# Altium footprint library Connectors.PCBLIB: 109 footprints (part 1 of 7)
Each footprint in its own frame and in the unit in brackets; x right, y up, seen from the top. Pads: shape width x height; smd on the part's side, far side on the other; paste and mask are expansions set on the pad; w line width, h text height; cw(c..) or ccw(c..) is an arc to the next point about the centre after c.
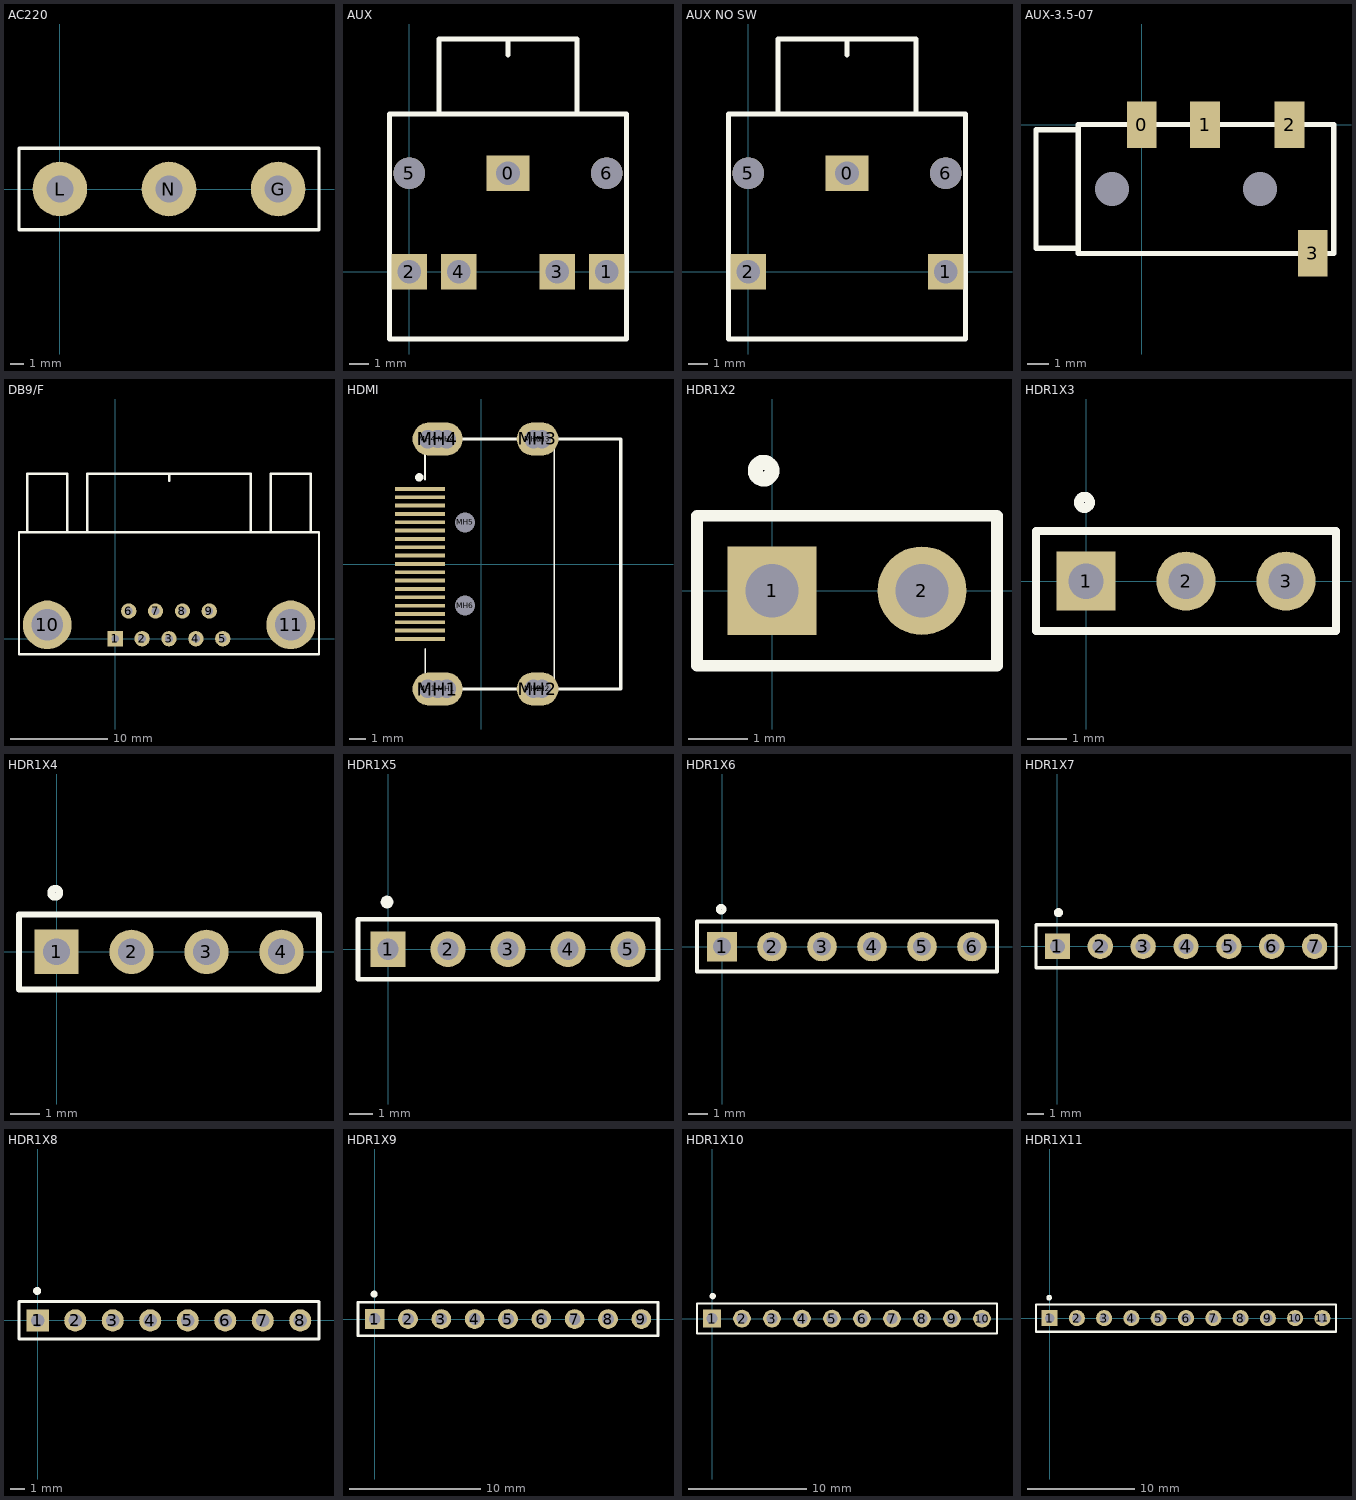
[diagram p0: the footprints below, top view; thin cyan lines are the x and y axes]

## AC220 [mm]
pads (3):
  round 4 hole 2: G(16,0) L(0,0) N(8,0)
Top Overlay:
  lines w0.254: -3,-3 -3,3 19,3 19,-3 -3,-3

## AUX [mm]
pads (7):
  rect 2.2x1.8 hole 1.2: 0(5,5)
  rect 1.8x1.8 hole 1.2: 1(10,0) 2(0,0) 3(7.5,0) 4(2.5,0)
  round 1.6 hole 1.6 unplated: 5(0,5) 6(10,5)
Top Overlay:
  lines w0.254: 1.5,8 1.5,11.8 8.4,11.8 ; 5,11 5,11.8 ; 8.5,8 8.5,11.8 ; -1,-3.4 11,-3.4 11,8 -1,8 -1,-3.4
3D body "耳": height 3.2, standoff -10.8, extent -1.041,-3.689 11.059,11.411

## AUX NO SW [mm]
pads (5):
  rect 2.2x1.8 hole 1.2: 0(5,5)
  rect 1.8x1.8 hole 1.2: 1(10,0) 2(0,0)
  round 1.6 hole 1.6 unplated: 5(0,5) 6(10,5)
Top Overlay:
  lines w0.254: 1.5,8 1.5,11.8 8.4,11.8 ; 5,11 5,11.8 ; 8.5,8 8.5,11.8 ; -1,-3.4 -1,8 11,8 11,-3.4 -1,-3.4
3D body "耳": height 3.2, standoff -10.8, extent -1.041,-3.689 11.059,11.411

## AUX-3.5-07 [mm]
pads (6):
  rect 1.4x2.2 smd: 0(-0.012,0) 1(2.988,0) 2(6.988,0) 3(8.088,-6.1)
  round 1 hole 1.6: ""(-1.412,-3.05) ""(5.588,-3.05)
Top Overlay:
  lines w0.254: -3.012,-5.85 -3.012,-6.1 9.088,-6.1 9.088,0 -3.012,0 -3.012,-0.25 ; -3.012,-5.85 -3.012,-0.25 ; -3.012,-5.85 -5.012,-5.85 -5.012,-0.25 -3.012,-0.25
3D body "SW3dPS-audio_buchse.STEP": height 4.06, standoff -0.01, extent -4.178,-6.507 7.792,0.827

## DB9/F [mm]
pads (11):
  rect 1.575x1.575 hole 0.8: 1(0,0)
  round 1.575 hole 0.8: 2(2.76,0) 3(5.52,0) 4(8.28,0) 5(11.04,0) 6(1.38,2.84) 7(4.14,2.84) 8(6.9,2.84) 9(9.66,2.84)
  round 5 hole 3.25: 10(-6.98,1.42) 11(18.02,1.42)
Top Overlay:
  lines w0.254: -9.05,10.92 -9.05,16.92 -4.94,16.92 ; -4.91,10.92 -4.91,16.92 ; -2.85,10.92 -2.85,16.92 13.9,16.92 13.9,10.92 ; 5.525,16.2 5.525,16.9 ; 15.95,10.92 15.95,16.92 20.06,16.92 ; 20.09,10.92 20.09,16.92 ; -9.88,-1.58 -9.88,10.92 20.92,10.92 20.92,-1.58 -9.88,-1.58
3D body "SW3dPS-9-PIN_DSUB-1.STEP": height 12.81, standoff -2.91, extent -9.925,-2.012 20.885,17.063

## HDMI [mm]
pads (33):
  rect 3x0.23 smd: 1(-3.656,4.5) 2(-3.656,4) 3(-3.656,3.5) 4(-3.656,3) 5(-3.656,2.5) 6(-3.656,2) 7(-3.656,1.5) 8(-3.656,1) 9(-3.656,0.5) 10(-3.656,0) 11(-3.656,-0.5) 12(-3.656,-1) 13(-3.656,-1.5) 14(-3.656,-2) 15(-3.656,-2.5) 16(-3.656,-3) 17(-3.656,-3.5) 18(-3.656,-4) 19(-3.656,-4.5)
  round 1.1 hole 1.1: MH1(-3.202,-7.493) MH1(-2.059,-7.493) MH2(3.148,-7.493) MH2(3.656,-7.493) MH3(3.148,7.493) MH3(3.656,7.493) MH4(-3.202,7.493) MH4(-2.059,7.493)
  oval 3x2 hole 1.1: MH1(-2.606,-7.5) MH4(-2.606,7.5)
  oval 2.5x2 hole 1: MH2(3.394,-7.5) MH3(3.394,7.5)
  round 1.1 hole 1.2: MH5(-0.956,2.5) MH6(-0.956,-2.5)
Top Overlay:
  circle w0.25: c-3.706,5.2 r0.125
  lines w0.1: -3.356,-5.08 -3.356,-7.5 3.894,-7.5 ; -3.356,5.073 -3.356,7.493 ; -3.213,7.5 4.037,7.5 ; 4.394,-7.5 4.394,7.5 ; 8.394,-7.5 8.394,7.5
  lines w0.2: -1.256,-7.5 3.894,-7.5 ; -1.256,7.5 3.394,7.5 ; 3.783,-7.5 8.394,-7.5 8.394,7.5 4.545,7.5
Mechanical 1:
  lines w0.1: -3.106,-8.05 cw(c-3.106,-7.5) -3.106,-6.95 -2.106,-6.95 cw(c-2.106,-7.5) -2.106,-8.05 -3.106,-8.05 ; -3.106,6.95 cw(c-3.106,7.5) -3.106,8.05 -2.106,8.05 cw(c-2.106,7.5) -2.106,6.95 -3.106,6.95 ; 3.148,-8.05 cw(c3.148,-7.5) 3.148,-6.95 3.656,-6.95 cw(c3.656,-7.5) 3.656,-8.05 3.148,-8.05 ; 3.148,6.95 cw(c3.148,7.5) 3.148,8.05 3.656,8.05 cw(c3.656,7.5) 3.656,6.95 3.148,6.95
3D body "User Library-10029449-001LF.STEP": height 5.98, standoff -2.02, extent -3.505,-8.354 6.395,7.846

## HDR1X2 [mm] "Connector; Header; 2 Position"
pads (2):
  rect 1.5x1.5 hole 0.9: 1(0,0)
  round 1.5 hole 0.9: 2(2.54,0)
Top Overlay:
  circle w0.254: c-0.141,2.032 r0.141
  lines w0.2: -1.27,-1.27 -1.27,1.27 3.81,1.27 3.81,-1.27 -1.27,-1.27
3D body "1001-2.STEP": height 8.54, standoff -3, extent -1.27,-1.27 3.81,1.27

## HDR1X3 [mm] "Connector; Header; 3 Position"
pads (3):
  rect 1.5x1.5 hole 0.9: 1(0,0)
  round 1.5 hole 0.9: 2(2.54,0) 3(5.08,0)
Top Overlay:
  circle w0.254: c-0.041,2 r0.141
  lines w0.2: -1.27,-1.27 -1.27,1.27 6.35,1.27 6.35,-1.27 -1.27,-1.27
3D body "1001-3.STEP": height 8.54, standoff -3, extent -1.27,-1.27 6.35,1.27

## HDR1X4 [mm] "Connector; Header; 4 Position"
pads (4):
  rect 1.5x1.5 hole 0.9: 1(0,0)
  round 1.5 hole 0.9: 2(2.54,0) 3(5.08,0) 4(7.62,0)
Top Overlay:
  circle w0.254: c-0.041,2 r0.141
  lines w0.2: -1.27,-1.27 8.89,-1.27 8.89,1.27 -1.27,1.27 -1.27,-1.27
3D body "1001-4.STEP": height 8.54, standoff -3, extent -1.27,-1.27 8.89,1.27

## HDR1X5 [mm] "Connector; Header; 5 Position"
pads (5):
  rect 1.5x1.5 hole 0.9: 1(0,0)
  round 1.5 hole 0.9: 2(2.54,0) 3(5.08,0) 4(7.62,0) 5(10.16,0)
Top Overlay:
  circle w0.254: c-0.041,2 r0.141
  lines w0.2: -1.27,-1.27 -1.27,1.27 11.43,1.27 11.43,-1.27 -1.27,-1.27
3D body "1001-5.STEP": height 8.54, standoff -3, extent -1.27,-1.27 11.43,1.27

## HDR1X6 [mm] "Connector; Header; 6 Position"
pads (6):
  rect 1.5x1.5 hole 0.9: 1(0,0)
  round 1.5 hole 0.9: 2(2.54,0) 3(5.08,0) 4(7.62,0) 5(10.16,0) 6(12.7,0)
Top Overlay:
  circle w0.254: c-0.041,1.9 r0.141
  lines w0.2: -1.27,-1.27 13.97,-1.27 13.97,1.27 -1.27,1.27 -1.27,-1.27
3D body "1001-6.STEP": height 8.54, standoff -3, extent -1.27,-1.27 13.97,1.27

## HDR1X7 [mm] "Connector; Header; 7 Position"
pads (7):
  rect 1.5x1.5 hole 0.9: 1(0,0)
  round 1.5 hole 0.9: 2(2.54,0) 3(5.08,0) 4(7.62,0) 5(10.16,0) 6(12.7,0) 7(15.24,0)
Top Overlay:
  circle w0.254: c0.059,2 r0.141
  lines w0.2: -1.27,-1.27 16.51,-1.27 16.51,1.27 -1.27,1.27 -1.27,-1.27
3D body "1001-7.STEP": height 8.54, standoff -3, extent -1.27,-1.27 16.51,1.27

## HDR1X8 [mm] "Connector; Header; 8 Position"
pads (8):
  rect 1.5x1.5 hole 0.9: 1(0,0)
  round 1.5 hole 0.9: 2(2.54,0) 3(5.08,0) 4(7.62,0) 5(10.16,0) 6(12.7,0) 7(15.24,0) 8(17.78,0)
Top Overlay:
  circle w0.254: c-0.041,2 r0.141
  lines w0.2: -1.27,-1.27 -1.27,1.27 19.05,1.27 19.05,-1.27 -1.27,-1.27
3D body "1001-8.STEP": height 8.54, standoff -3, extent -1.27,-1.27 19.05,1.27

## HDR1X9 [mm] "Connector; Header; 9 Position"
pads (9):
  rect 1.5x1.5 hole 0.9: 1(0,0)
  round 1.5 hole 0.9: 2(2.54,0) 3(5.08,0) 4(7.62,0) 5(10.16,0) 6(12.7,0) 7(15.24,0) 8(17.78,0) 9(20.32,0)
Top Overlay:
  circle w0.254: c-0.041,1.9 r0.141
  lines w0.2: -1.27,-1.27 21.59,-1.27 21.59,1.27 -1.27,1.27 -1.27,-1.27
3D body "HDR1x9.STEP": height 8.54, standoff -3, extent -1.27,-1.27 21.59,1.27

## HDR1X10 [mm] "Connector; Header; 10 Position"
pads (10):
  rect 1.5x1.5 hole 0.9: 1(0,0)
  round 1.5 hole 0.9: 2(2.54,0) 3(5.08,0) 4(7.62,0) 5(10.16,0) 6(12.7,0) 7(15.24,0) 8(17.78,0) 9(20.32,0) 10(22.86,0)
Top Overlay:
  circle w0.254: c0.059,1.9 r0.141
  lines w0.2: -1.27,-1.27 -1.27,1.27 0.635,1.27 24.13,1.27 24.13,-1.27 -1.27,-1.27
3D body "HDR1x10.STEP": height 8.54, standoff -3, extent -1.27,-1.27 24.13,1.27

## HDR1X11 [mm] "Connector; Header; 11 Position"
pads (11):
  rect 1.5x1.5 hole 0.9: 1(0,0)
  round 1.5 hole 0.9: 2(2.54,0) 3(5.08,0) 4(7.62,0) 5(10.16,0) 6(12.7,0) 7(15.24,0) 8(17.78,0) 9(20.32,0) 10(22.86,0) 11(25.4,0)
Top Overlay:
  circle w0.254: c-0.041,1.9 r0.141
  lines w0.2: -1.27,-1.27 -1.27,1.27 0.635,1.27 26.67,1.27 26.67,-1.27 -1.27,-1.27
3D body "HDR1x11.STEP": height 8.54, standoff -3, extent -1.27,-1.27 26.67,1.27